# Altium footprint library Nhat_Lib.PcbLib: 84 footprints (part 2 of 6)
Each footprint in its own frame and in the unit in brackets; x right, y up, seen from the top. Pads: shape width x height; smd on the part's side, far side on the other; paste and mask are expansions set on the pad; w line width, h text height; cw(c..) or ccw(c..) is an arc to the next point about the centre after c.
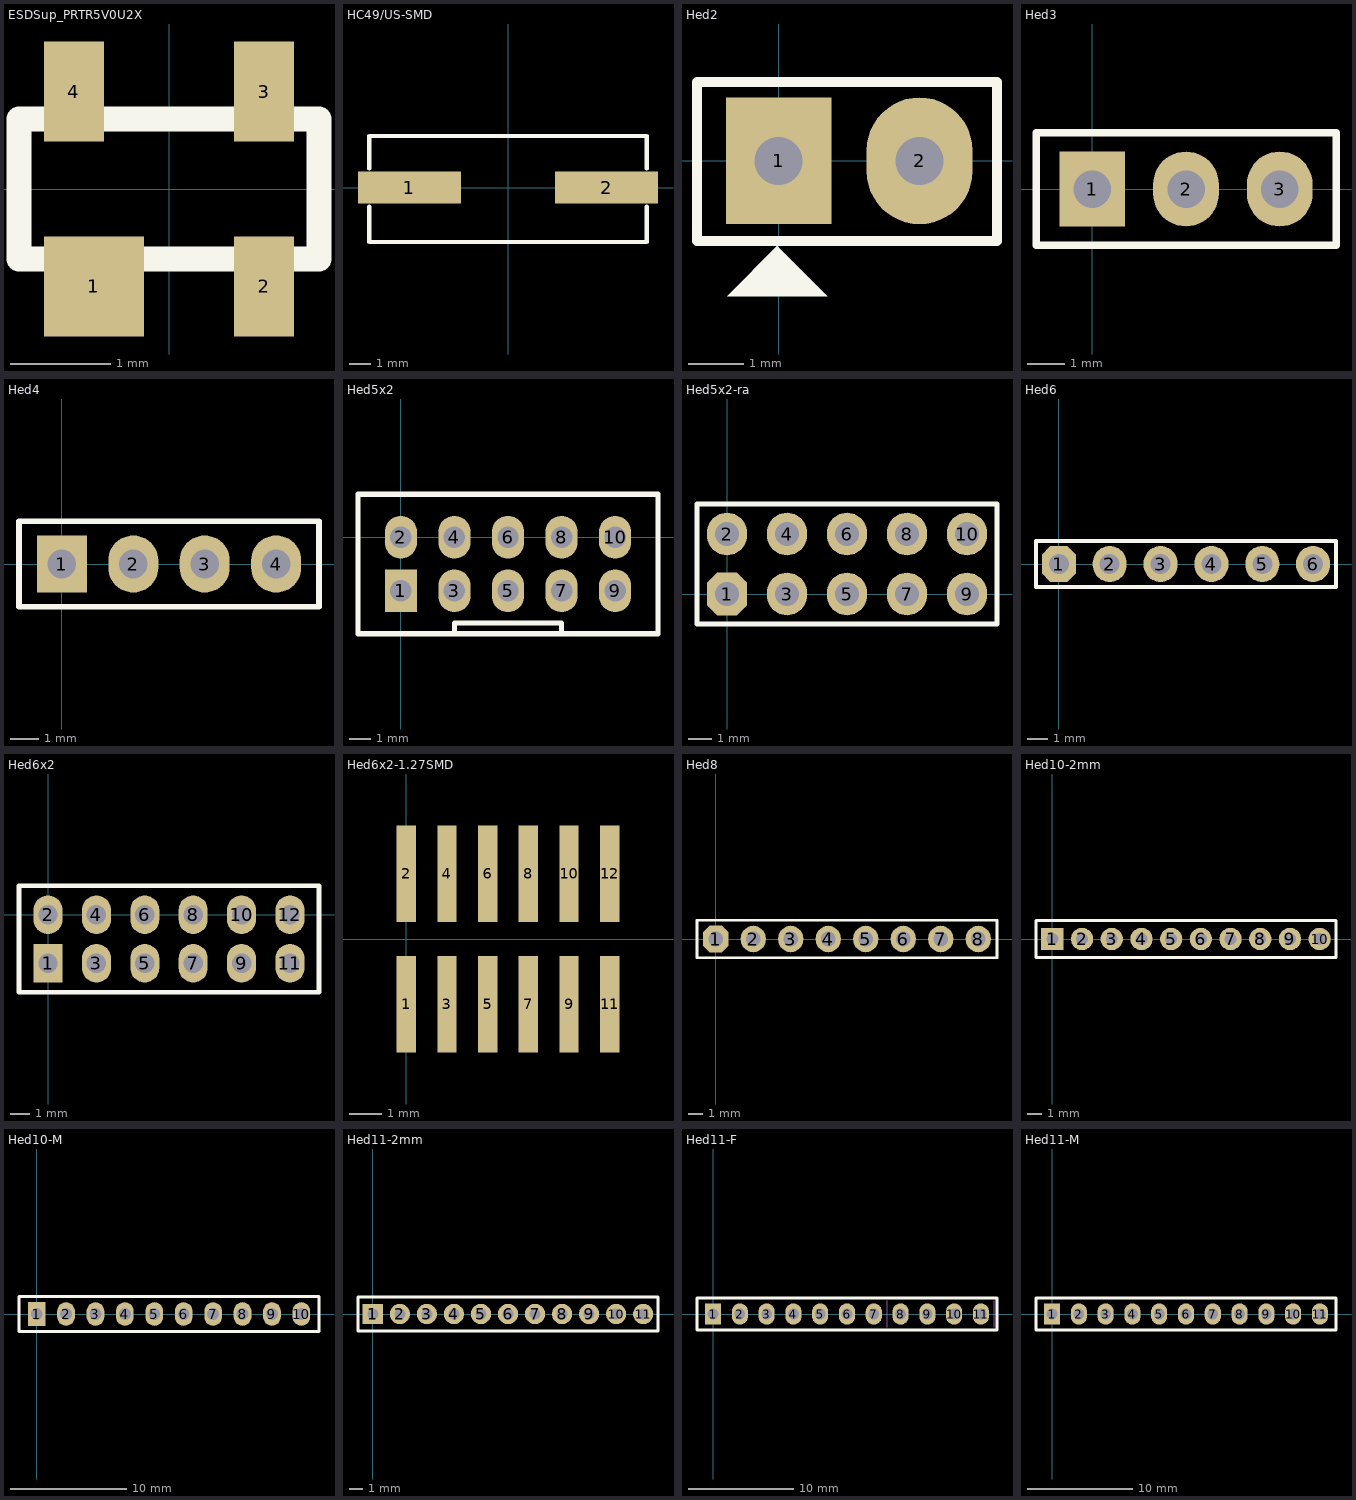
[diagram p1: the footprints below, top view; thin cyan lines are the x and y axes]

## ESDSup_PRTR5V0U2X [mm] "Ultra low capacitance double rail-to-rail ESD protection diode"
pads (4):
  rect 1x1 smd: 1(-0.75,-0.975)
  rect 0.6x1 smd: 2(0.95,-0.975) 3(0.95,0.975) 4(-0.95,0.975)
Top Overlay:
  lines w0.254: -1.5,-0.7 1.5,-0.7 1.5,0.7 -1.5,0.7 -1.5,-0.7

## HC49/US-SMD [mm]
pads (2):
  rect 4.8x1.5 smd: 1(-4.6,0) 2(4.6,0)
Top Overlay:
  lines w0.2: -6.477,-0.889 -6.477,-2.54 6.477,-2.54 6.477,-0.889 ; -6.477,0.889 -6.477,2.413 6.477,2.413 6.477,0.889
3D body: height 4.2, standoff 0, extent -6.35,-2.414 6.35,2.286

## Hed2 [mil]
pads (2):
  rect 75x90 hole 34: 1(0,0)
  oval 75x90 hole 34: 2(100,0)
Top Overlay:
  region: -36.5,-96 34.5,-96 -0.5,-61 -0.5,-60
  lines w7: -58,-57 155,-57 155,56 -58,56 -58,-57

## Hed3 [mil]
pads (3):
  rect 70x80 hole 40: 1(0,0)
  oval 70x80 hole 40: 2(100,0) 3(200,0)
Top Overlay:
  lines w8: -60,-60 260,-60 260,60 -60,60 -60,-60

## Hed4 [mil]
pads (4):
  rect 70x80 hole 40: 1(0,0)
  oval 70x80 hole 40: 2(100,0) 3(200,0) 4(300,0)
Top Overlay:
  lines w8: -60,-60 -60,60 360,60 360,-60 -60,-60

## Hed5x2 [mil]
pads (10):
  rect 60x80 hole 40: 1(0,-100)
  oval 60x80 hole 40: 2(0,0) 3(100,-100) 4(100,0) 5(200,-100) 6(200,0) 7(300,-100) 8(300,0) 9(400,-100) 10(400,0)
Top Overlay:
  lines w10: 100,-180 -80,-180 -80,80 480,80 480,-180 300,-180 ; 100,-180 100,-160 300,-160 300,-180 ; 100,-180 300,-180

## Hed5x2-ra [mm]
pads (10):
  oct 1.7x1.8 hole 1: 1(0,0)
  oval 1.7x1.8 hole 1: 2(0,2.54) 3(2.54,0) 4(2.54,2.54) 5(5.08,0) 6(5.08,2.54) 7(7.62,0) 8(7.62,2.54) 9(10.16,0) 10(10.16,2.54)
Top Overlay:
  lines w0.2: -1.27,-1.27 -1.27,3.81 11.43,3.81 11.43,-1.27 -1.27,-1.27
Mechanical 15 keep-out:
  lines w0.1: -1.27,-1.27 -1.27,3.81 11.43,3.81 11.43,-1.27 -1.27,-1.27
3D body: height 9.86, standoff -3.05, extent -5.08,-3.302 15.24,5.842

## Hed6 [mm] "Header 6 pin 2.54mm"
pads (6):
  oct 1.7x1.8 hole 1: 1(0,0)
  oval 1.7x1.8 hole 1: 2(2.54,0) 3(5.08,0) 4(7.62,0) 5(10.16,0) 6(12.7,0)
Top Overlay:
  lines w0.2: -1.143,-1.143 13.843,-1.143 13.843,1.143 -1.143,1.143 -1.143,-1.143
Mechanical 15:
  lines w0.1: -1.143,-1.143 13.843,-1.143 13.843,1.143 -1.143,1.143 -1.143,-1.143
3D body: height 8, standoff 0, extent -1.27,-1.27 1.27,0
3D body: height 0, standoff -1, extent 2.286,-0.254 2.794,0.254
3D body: height 0, standoff -1, extent -0.254,-0.254 0.254,0.254
3D body: height 8, standoff 0, extent 1.27,-1.27 3.81,0
3D body: height 8, standoff 0, extent 1.27,0 3.81,1.27
3D body: height 8, standoff 0, extent -1.27,0 1.27,1.27
3D body: height 8, standoff 0, extent 3.81,0 6.35,1.27
3D body: height 8, standoff 0, extent 3.81,-1.27 6.35,0
3D body: height 0, standoff -1, extent 4.826,-0.254 5.334,0.254
3D body: height 8, standoff 0, extent 6.35,0 8.89,1.27
3D body: height 8, standoff 0, extent 6.35,-1.27 8.89,0
3D body: height 0, standoff -1, extent 7.366,-0.254 7.874,0.254
3D body: height 0, standoff -1, extent 12.446,-0.254 12.954,0.254
3D body: height 8, standoff 0, extent 11.43,-1.27 13.97,0
3D body: height 8, standoff 0, extent 11.43,0 13.97,1.27
3D body: height 8, standoff 0, extent 8.89,0 11.43,1.27
3D body: height 8, standoff 0, extent 8.89,-1.27 11.43,0
3D body: height 0, standoff -1, extent 9.906,-0.254 10.414,0.254

## Hed6x2 [mil]
pads (12):
  rect 60x80 hole 40: 1(0,-100)
  oval 60x80 hole 40: 2(0,0) 3(100,-100) 4(100,0) 5(200,-100) 6(200,0) 7(300,-100) 8(300,0) 9(400,-100) 10(400,0) 11(500,-100) 12(500,0)
Top Overlay:
  lines w10: -60,-160 560,-160 560,60 -60,60 -60,-160

## Hed6x2-1.27SMD [mm]
pads (12):
  rect 0.6x3 smd: 1(0,-2.032) 2(0,2.032) 3(1.27,-2.032) 4(1.27,2.032) 5(2.54,-2.032) 6(2.54,2.032) 7(3.81,-2.032) 8(3.81,2.032) 9(5.08,-2.032) 10(5.08,2.032) 11(6.35,-2.032) 12(6.35,2.032)

## Hed8 [mm]
pads (8):
  oct 1.7x1.8 hole 1: 1(0,0)
  oval 1.7x1.8 hole 1: 2(2.54,0) 3(5.08,0) 4(7.62,0) 5(10.16,0) 6(12.7,0) 7(15.24,0) 8(17.78,0)
Top Overlay:
  lines w0.2: -1.27,-1.27 -1.27,1.27 19.05,1.27 19.05,-1.27 -1.27,-1.27
Mechanical 15:
  lines w0.1: -1.27,-1.27 -1.27,1.27 19.05,1.27 19.05,-1.27 -1.27,-1.27
3D body: height 0, standoff -1, extent 17.526,-0.254 18.034,0.254
3D body: height 8, standoff 0, extent 16.51,-1.27 19.05,0
3D body: height 8, standoff 0, extent 16.51,0 19.05,1.27
3D body: height 0, standoff -1, extent 9.906,-0.254 10.414,0.254
3D body: height 8, standoff 0, extent 8.89,-1.27 11.43,0
3D body: height 8, standoff 0, extent 8.89,0 11.43,1.27
3D body: height 8, standoff 0, extent 11.43,0 13.97,1.27
3D body: height 8, standoff 0, extent 11.43,-1.27 13.97,0
3D body: height 0, standoff -1, extent 12.446,-0.254 12.954,0.254
3D body: height 8, standoff 0, extent 13.97,0 16.51,1.27
3D body: height 8, standoff 0, extent 13.97,-1.27 16.51,0
3D body: height 0, standoff -1, extent 14.986,-0.254 15.494,0.254
3D body: height 0, standoff -1, extent 7.366,-0.254 7.874,0.254
3D body: height 8, standoff 0, extent 6.35,-1.27 8.89,0
3D body: height 8, standoff 0, extent 6.35,0 8.89,1.27
3D body: height 0, standoff -1, extent 4.826,-0.254 5.334,0.254
3D body: height 8, standoff 0, extent 3.81,-1.27 6.35,0
3D body: height 8, standoff 0, extent 3.81,0 6.35,1.27
3D body: height 8, standoff 0, extent -1.27,0 1.27,1.27
3D body: height 8, standoff 0, extent 1.27,0 3.81,1.27
3D body: height 8, standoff 0, extent 1.27,-1.27 3.81,0
3D body: height 0, standoff -1, extent -0.254,-0.254 0.254,0.254
3D body: height 0, standoff -1, extent 2.286,-0.254 2.794,0.254
3D body: height 8, standoff 0, extent -1.27,-1.27 1.27,0

## Hed10-2mm [mm]
pads (10):
  rect 1.5x1.5 hole 0.8: 1(0,0)
  round 1.5 hole 0.8: 2(2,0) 3(4,0) 4(6,0) 5(8,0) 6(10,0) 7(12,0) 8(14,0) 9(16,0) 10(18,0)
Top Overlay:
  lines w0.203: -1.1,-1.25 19.1,-1.25 19.1,1.25 -1.1,1.25 -1.1,-1.25
3D body: height 4.3, standoff 0, extent 15,0 17,1.2
3D body: height 4.3, standoff 0, extent 15,-1.2 17,0
3D body: height 4.3, standoff 0, extent 17,-1.2 19,0
3D body: height 4.3, standoff 0, extent 17,0 19,1.2
3D body: height 4.3, standoff 0, extent 7,0 9,1.2
3D body: height 4.3, standoff 0, extent 7,-1.2 9,0
3D body: height 4.3, standoff 0, extent 9,-1.2 11,0
3D body: height 4.3, standoff 0, extent 9,0 11,1.2
3D body: height 4.3, standoff 0, extent 13,0 15,1.2
3D body: height 4.3, standoff 0, extent 13,-1.2 15,0
3D body: height 4.3, standoff 0, extent 11,-1.2 13,0
3D body: height 4.3, standoff 0, extent 11,0 13,1.2
3D body: height 4.3, standoff 0, extent 3,0 5,1.2
3D body: height 4.3, standoff 0, extent 3,-1.2 5,0
3D body: height 4.3, standoff 0, extent 5,-1.2 7,0
3D body: height 4.3, standoff 0, extent 5,0 7,1.2
3D body: height 4.3, standoff 0, extent 1,0 3,1.2
3D body: height 4.3, standoff 0, extent 1,-1.2 3,0
3D body: height 4.3, standoff 0, extent -1,-1.2 1,0
3D body: height 4.3, standoff 0, extent -1,0 1,1.2

## Hed10-M [mil]
pads (10):
  rect 60x80 hole 40: 1(0,0)
  oval 60x80 hole 40: 2(100,0) 3(200,0) 4(300,0) 5(400,0) 6(500,0) 7(600,0) 8(700,0) 9(800,0) 10(900,0)
Top Overlay:
  lines w10: -60,-60 -60,60 960,60 960,-60 -60,-60
3D body: height 314.96, standoff -39.37, extent 890,-10 910,10
3D body: height 314.96, standoff -39.37, extent 790,-10 810,10
3D body: height 314.96, standoff -39.37, extent 690,-10 710,10
3D body: height 314.96, standoff -39.37, extent 590,-10 610,10
3D body: height 314.96, standoff -39.37, extent 490,-10 510,10
3D body: height 314.96, standoff -39.37, extent 390,-10 410,10
3D body: height 314.96, standoff -39.37, extent 290,-10 310,10
3D body: height 314.96, standoff -39.37, extent 190,-10 210,10
3D body: height 314.96, standoff -39.37, extent 90,-10 110,10
3D body: height 314.96, standoff -39.37, extent -10,-10 10,10
3D body: height 78.74, standoff 0, extent 850,-50 950,50
3D body: height 78.74, standoff 0, extent 750,-50 850,50
3D body: height 78.74, standoff 0, extent 650,-50 750,50
3D body: height 78.74, standoff 0, extent 550,-50 650,50
3D body: height 78.74, standoff 0, extent 450,-50 550,50
3D body: height 78.74, standoff 0, extent 350,-50 450,50
3D body: height 78.74, standoff 0, extent 250,-50 350,50
3D body: height 78.74, standoff 0, extent 150,-50 250,50
3D body: height 78.74, standoff 0, extent 50,-50 150,50
3D body: height 78.74, standoff 0, extent -50,-50 50,50

## Hed11-2mm [mm]
pads (11):
  rect 1.5x1.5 hole 0.8: 1(0,0)
  round 1.5 hole 0.8: 2(2,0) 3(4,0) 4(6,0) 5(8,0) 6(10,0) 7(12,0) 8(14,0) 9(16,0) 10(18,0) 11(20,0)
Top Overlay:
  lines w0.203: 21.082,-1.25 -1.1,-1.25 -1.1,1.25 21.082,1.25 ; 21.1,-1.25 21.1,1.25
3D body: height 4.3, standoff 0, extent 19,0 21,1.2
3D body: height 4.3, standoff 0, extent 19,-1.2 21,0
3D body: height 4.3, standoff 0, extent 15,0 17,1.2
3D body: height 4.3, standoff 0, extent 15,-1.2 17,0
3D body: height 4.3, standoff 0, extent 17,-1.2 19,0
3D body: height 4.3, standoff 0, extent 17,0 19,1.2
3D body: height 4.3, standoff 0, extent 7,0 9,1.2
3D body: height 4.3, standoff 0, extent 7,-1.2 9,0
3D body: height 4.3, standoff 0, extent 9,-1.2 11,0
3D body: height 4.3, standoff 0, extent 9,0 11,1.2
3D body: height 4.3, standoff 0, extent 13,0 15,1.2
3D body: height 4.3, standoff 0, extent 13,-1.2 15,0
3D body: height 4.3, standoff 0, extent 11,-1.2 13,0
3D body: height 4.3, standoff 0, extent 11,0 13,1.2
3D body: height 4.3, standoff 0, extent 3,0 5,1.2
3D body: height 4.3, standoff 0, extent 3,-1.2 5,0
3D body: height 4.3, standoff 0, extent 5,-1.2 7,0
3D body: height 4.3, standoff 0, extent 5,0 7,1.2
3D body: height 4.3, standoff 0, extent 1,0 3,1.2
3D body: height 4.3, standoff 0, extent 1,-1.2 3,0
3D body: height 4.3, standoff 0, extent -1,-1.2 1,0
3D body: height 4.3, standoff 0, extent -1,0 1,1.2

## Hed11-F [mil]
pads (11):
  rect 60x80 hole 40: 1(0,0)
  oval 60x80 hole 40: 2(100,0) 3(200,0) 4(300,0) 5(400,0) 6(500,0) 7(600,0) 8(700,0) 9(800,0) 10(900,0) 11(1000,0)
Top Overlay:
  lines w10: -60,-60 -60,60 1060,60 1060,-60 -60,-60
Mechanical 15:
  lines w3.94: 650,-50 650,50 ; 1050,-50 1050,50
3D body: height 0, standoff -39.37, extent 590,-10 610,10
3D body: height 314.96, standoff 0, extent 550,-50 650,0
3D body: height 314.96, standoff 0, extent 550,0 650,50
3D body: height 0, standoff -39.37, extent 290,-10 310,10
3D body: height 314.96, standoff 0, extent 250,-50 350,0
3D body: height 314.96, standoff 0, extent 250,0 350,50
3D body: height 314.96, standoff 0, extent 350,0 450,50
3D body: height 314.96, standoff 0, extent 350,-50 450,0
3D body: height 0, standoff -39.37, extent 390,-10 410,10
3D body: height 314.96, standoff 0, extent 450,0 550,50
3D body: height 314.96, standoff 0, extent 450,-50 550,0
3D body: height 0, standoff -39.37, extent 490,-10 510,10
3D body: height 0, standoff -39.37, extent 190,-10 210,10
3D body: height 314.96, standoff 0, extent 150,-50 250,0
3D body: height 314.96, standoff 0, extent 150,0 250,50
3D body: height 0, standoff -39.37, extent 90,-10 110,10
3D body: height 314.96, standoff 0, extent 50,-50 150,0
3D body: height 314.96, standoff 0, extent 50,0 150,50
3D body: height 314.96, standoff 0, extent -50,0 50,50
3D body: height 314.96, standoff 0, extent -50,-50 50,0
3D body: height 0, standoff -39.37, extent -10,-10 10,10
3D body: height 0, standoff -39.37, extent 890,-10 910,10
3D body: height 314.96, standoff 0, extent 850,-50 950,0
3D body: height 314.96, standoff 0, extent 850,0 950,50
3D body: height 0, standoff -39.37, extent 790,-10 810,10
3D body: height 314.96, standoff 0, extent 750,-50 850,0
3D body: height 314.96, standoff 0, extent 750,0 850,50
3D body: height 314.96, standoff 0, extent 650,0 750,50
3D body: height 314.96, standoff 0, extent 650,-50 750,0
3D body: height 0, standoff -39.37, extent 690,-10 710,10
3D body: height 314.96, standoff 0, extent 950,0 1050,50
3D body: height 314.96, standoff 0, extent 950,-50 1050,0
3D body: height 0, standoff -39.37, extent 990,-10 1010,10

## Hed11-M [mil]
pads (11):
  rect 60x80 hole 40: 1(0,0)
  oval 60x80 hole 40: 2(100,0) 3(200,0) 4(300,0) 5(400,0) 6(500,0) 7(600,0) 8(700,0) 9(800,0) 10(900,0) 11(1000,0)
Top Overlay:
  lines w10: -60,-60 -60,60 1060,60 1060,-60 -60,-60
3D body: height 314.96, standoff -39.37, extent 990,-10 1010,10
3D body: height 314.96, standoff -39.37, extent 890,-10 910,10
3D body: height 314.96, standoff -39.37, extent 790,-10 810,10
3D body: height 314.96, standoff -39.37, extent 690,-10 710,10
3D body: height 314.96, standoff -39.37, extent 590,-10 610,10
3D body: height 314.96, standoff -39.37, extent 490,-10 510,10
3D body: height 314.96, standoff -39.37, extent 390,-10 410,10
3D body: height 314.96, standoff -39.37, extent 290,-10 310,10
3D body: height 314.96, standoff -39.37, extent 190,-10 210,10
3D body: height 314.96, standoff -39.37, extent 90,-10 110,10
3D body: height 314.96, standoff -39.37, extent -10,-10 10,10
3D body: height 78.74, standoff 0, extent 950,-50 1050,50
3D body: height 78.74, standoff 0, extent 850,-50 950,50
3D body: height 78.74, standoff 0, extent 750,-50 850,50
3D body: height 78.74, standoff 0, extent 650,-50 750,50
3D body: height 78.74, standoff 0, extent 550,-50 650,50
3D body: height 78.74, standoff 0, extent 450,-50 550,50
3D body: height 78.74, standoff 0, extent 350,-50 450,50
3D body: height 78.74, standoff 0, extent 250,-50 350,50
3D body: height 78.74, standoff 0, extent 150,-50 250,50
3D body: height 78.74, standoff 0, extent 50,-50 150,50
3D body: height 78.74, standoff 0, extent -50,-50 50,50